# Altium footprint library PcbLib.PcbLib: 142 footprints (part 8 of 9)
Each footprint in its own frame and in the unit in brackets; x right, y up, seen from the top. Pads: shape width x height; smd on the part's side, far side on the other; paste and mask are expansions set on the pad; w line width, h text height; cw(c..) or ccw(c..) is an arc to the next point about the centre after c.
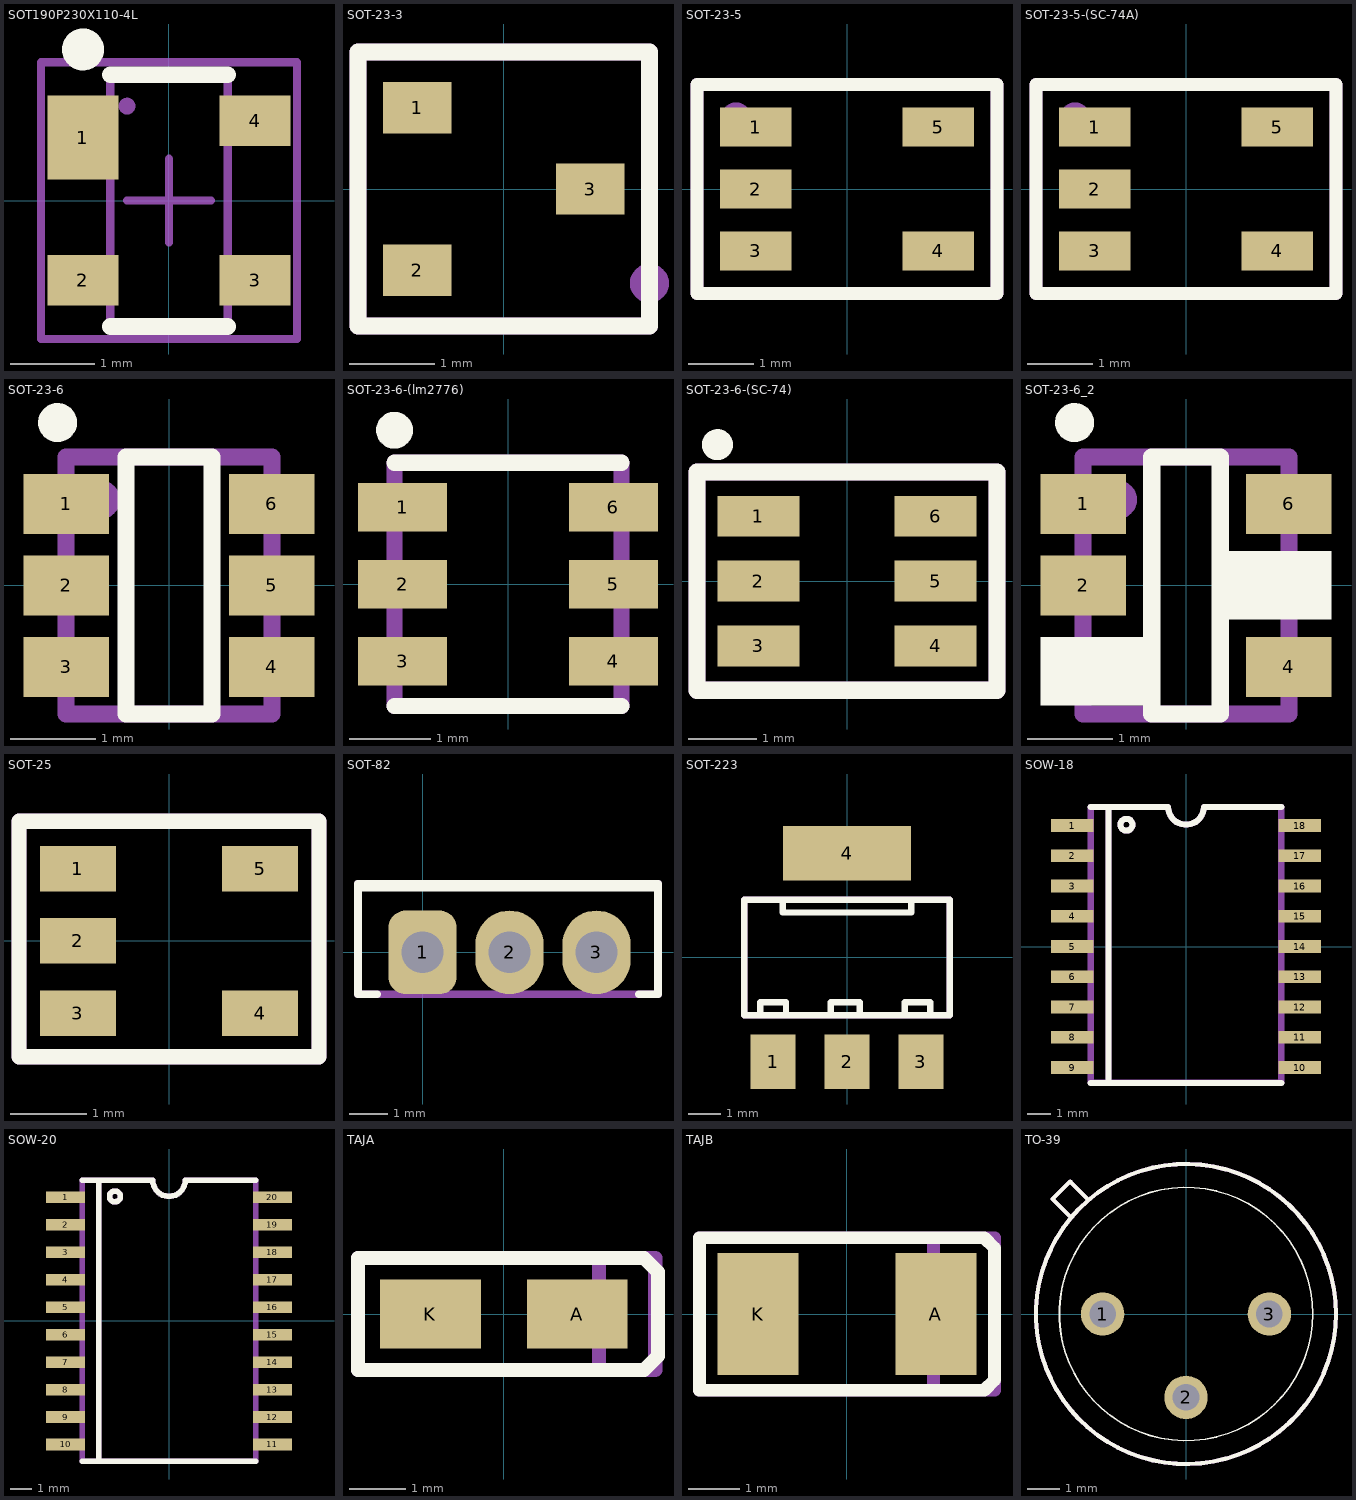
[diagram p7: the footprints below, top view; thin cyan lines are the x and y axes]

## SOT190P230X110-4L [mm]
pads (4):
  rect 0.85x1 smd: 1(-1.025,0.75)
  rect 0.85x0.6 smd: 2(-1.025,-0.95) 3(1.025,-0.95) 4(1.025,0.95)
Top Overlay:
  circle w0.25: c-1.025,1.8 r0.125
  lines w0.2: -0.7,-1.5 0.7,-1.5 ; -0.7,1.5 0.7,1.5
Mechanical 29:
  circle w0.1: c-0.5,1.125 r0.05
  lines w0.1: -0.7,-1.5 -0.7,1.5 0.7,1.5 0.7,-1.5 -0.7,-1.5
  text ".Designator" at -0.152,0.178 h0.3
Mechanical 15:
  lines w0.1: -0.5,0 0.5,0 ; 0,-0.5 0,0.5 ; -1.525,-1.65 -1.525,1.65 1.525,1.65 1.525,-1.65 -1.525,-1.65
3D body "User Library-sot143.step": height 1, standoff 0, extent -1.21,-1.46 1.21,1.46

## SOT-23-3 [mm]
pads (3):
  rect 0.8x0.6 smd: 1(-1.01,0.95) 2(-1.01,-0.95) 3(1.01,0)
Top Overlay:
  lines w0.2: -1.7,-1.6 1.7,-1.6 1.7,1.6 -1.7,1.6 -1.7,-1.6
Mechanical 29:
  circle w0.254: c1.7,-1.1 r0.1
  lines w0.2: -1.7,-1.6 1.7,-1.6 1.7,1.6 -1.7,1.6 -1.7,-1.6
  text ".Designator" at -1.146,-0.513 h1
3D body "CircuitWorks-SOT-23.step": height 1.1, standoff 0, extent -1.25,-1.5 1.25,1.5

## SOT-23-5 [mm]
pads (5):
  rect 1.1x0.6 smd: 1(-1.4,0.95) 2(-1.4,0) 3(-1.4,-0.95) 4(1.4,-0.95) 5(1.4,0.95)
Top Overlay:
  lines w0.2: -2.3,-1.6 2.3,-1.6 2.3,1.6 -2.3,1.6 -2.3,-1.6
Mechanical 29:
  circle w0.254: c-1.7,1.1 r0.1
  lines w0.2: -2.3,-1.6 2.3,-1.6 2.3,1.6 -2.3,1.6 -2.3,-1.6
  text ".Designator" at -1.146,-0.513 h1
3D body "SOT-23-5.step": height 1.1, standoff 0, extent -1.225,-1.5 1.275,1.5

## SOT-23-5-(SC-74A) [mm]
pads (5):
  rect 1.1x0.6 smd: 1(-1.4,0.95) 2(-1.4,0) 3(-1.4,-0.95) 4(1.4,-0.95) 5(1.4,0.95)
Top Overlay:
  lines w0.2: -2.3,-1.6 -2.3,1.6 2.3,1.6 2.3,-1.6 -2.3,-1.6
Mechanical 29:
  circle w0.254: c-1.7,1.1 r0.1
  lines w0.2: -2.3,-1.6 -2.3,1.6 2.3,1.6 2.3,-1.6 -2.3,-1.6
  text ".Designator" at -1.146,-0.513 h1
3D body "SOT95P280X145-5N_EIAJ_SC-74A_MICROCHIP_OT_SOT23_5-LEADS.STEP": height 1.45, standoff 0, extent -1.4,-1.45 1.4,1.5

## SOT-23-6 [mm]
pads (6):
  rect 1x0.7 smd mask+0.05: 1(-1.2,0.95) 2(-1.2,0) 3(-1.2,-0.95) 4(1.2,-0.95) 5(1.2,0) 6(1.2,0.95)
Top Overlay:
  lines w0.2: -0.5,-1.5 0.5,-1.5 0.5,1.5 -0.5,1.5 -0.5,-1.5
  lines w0.254: -1.203,1.876 cw(c-1.3,1.9) -1.2,1.9
Mechanical 29:
  circle w0.254: c-0.8,1 r0.1
  lines w0.2: -1.2,-1.5 -1.2,1.5 1.2,1.5 1.2,-1.5 -1.2,-1.5
  text ".Designator" at -0.8,-0.567 h1
3D body "SOT-23-6.step": height 1.09, standoff 0, extent -1.2,-1.397 1.226,1.397

## SOT-23-6-(lm2776) [mm]
pads (6):
  rect 1.1x0.6 smd: 1(-1.3,0.95) 2(-1.3,0) 3(-1.3,-0.95) 4(1.3,-0.95) 5(1.3,0) 6(1.3,0.95)
Top Overlay:
  circle w0.254: c-1.4,1.9 r0.1
  lines w0.2: -1.4,-1.5 1.4,-1.5 ; -1.4,1.5 1.4,1.5
Mechanical 29:
  circle w0.254: c-1,1 r0.1
  lines w0.2: -1.4,-1.5 -1.4,1.5 1.4,1.5 1.4,-1.5 -1.4,-1.5
  text ".Designator" at -0.9,-0.567 h1
3D body "LM2776DBVR.STEP": height 1.45, standoff 0, extent -1.4,-1.45 1.4,1.45

## SOT-23-6-(SC-74) [mm]
pads (6):
  rect 1.2x0.6 smd: 1(-1.3,0.95) 2(-1.3,0) 3(-1.3,-0.95) 4(1.3,-0.95) 5(1.3,0) 6(1.3,0.95)
Top Overlay:
  circle w0.254: c-1.9,2 r0.1
  lines w0.254: -2.2,-1.6 -2.2,1.6 2.2,1.6 2.2,-1.6 -2.2,-1.6
Mechanical 29:
  circle w0.254: c-1.3,1 r0.1
  lines w0.254: -2.2,-1.6 -2.2,1.6 2.2,1.6 2.2,-1.6 -2.2,-1.6
  text ".Designator" at -0.8,-0.567 h1
3D body "SOT23-6.stp": height 1.2, standoff 0.02, extent -1.418,-1.5 1.418,1.5

## SOT-23-6_2 [mm] "AP6972S"
pads (4):
  rect 1x0.7 smd mask+0.05: 1(-1.2,0.95) 2(-1.2,0) 4(1.2,-0.95) 6(1.2,0.95)
Top Overlay:
  rectangle: -1.7,-1.4 -0.4,-0.6
  rectangle: 0.4,-0.4 1.7,0.4
  lines w0.2: -0.4,-1.5 0.4,-1.5 0.4,1.5 -0.4,1.5 -0.4,-1.5
  lines w0.254: -1.203,1.876 cw(c-1.3,1.9) -1.2,1.9
Mechanical 29:
  circle w0.254: c-0.8,1 r0.1
  lines w0.2: -1.2,-1.5 -1.2,1.5 1.2,1.5 1.2,-1.5 -1.2,-1.5
  text ".Designator" at -0.8,-0.567 h1
3D body "SOT-23-6.step": height 1.09, standoff 0, extent -1.2,-1.397 1.226,1.397

## SOT-25 [mm]
pads (5):
  rect 1x0.6 smd mask+0.08: 1(-1.2,0.95) 2(-1.2,0) 3(-1.2,-0.95) 4(1.2,-0.95) 5(1.2,0.95)
Top Overlay:
  lines w0.2: -0.088,1.575 1.975,1.575 1.975,-1.525 -1.975,-1.525 -1.975,1.575 0.088,1.575
Mechanical 29:
  circle w0.254: c-1.25,0.975 r0.09
  lines w0.2: -0.088,1.575 1.975,1.575 1.975,-1.525 -1.975,-1.525 -1.975,1.575 0.088,1.575
  text ".Designator" at -0.846,-0.538 h1
3D body "SOT-25.step": height 1.2, standoff 0, extent -1.35,-1.425 1.45,1.475

## SOT-82 [mm]
pads (3):
  rrect50% 1.8x2.2 hole 1.1: 1(0,0)
  oval 1.8x2.2 hole 1.1: 2(2.29,0) 3(4.58,0)
Top Overlay:
  lines w0.2: -1.7,1.7 6.1,1.7 ; -1.2,-1.1 -1.7,-1.1 -1.7,1.8 6.2,1.8 6.2,-1.1 5.7,-1.1
Mechanical 29:
  circle w0.254: c0,0 r0.1
  lines w0.2: -1.7,-1.1 -1.7,1.8 6.2,1.8 6.2,-1.1 -1.7,-1.1
  text ".Designator" at 0.8,-0.167 h1
3D body "User Library-SOT-82.step": height 17.2, standoff -9.44, extent -1.61,-1.01 6.19,1.79

## SOT-223 [mm]
pads (4):
  rect 1.4x1.7 smd: 1(-2.3,-3.25) 2(0,-3.25) 3(2.3,-3.25)
  rect 4x1.7 smd: 4(0,3.25)
Top Overlay:
  lines w0.2: -2.7,-1.8 -2.7,-1.4 -1.9,-1.4 -1.9,-1.8 ; -2,1.8 -2,1.4 2,1.4 2,1.8 ; -0.5,-1.8 -0.5,-1.4 0.4,-1.4 0.4,-1.6 0.4,-1.8 ; 1.8,-1.8 1.8,-1.4 2.6,-1.4 2.6,-1.7 ; -3.2,-1.8 -3.2,1.8 3.2,1.8 3.2,-1.8 -3.2,-1.8
Mechanical 29:
  lines w0.2: -3.2,-1.8 3.2,-1.8 3.2,1.8 -3.2,1.8 -3.2,-1.8
  text ".Designator" at -1.3,-0.367 h1
3D body "User Library-sot-223.step": height 1.64, standoff -0.04, extent -3.25,-3.466 3.25,3.466

## SOW-18 [mil]
pads (18):
  rect 71x21 smd: 1(-188,200) 2(-188,150) 3(-188,100) 4(-188,50) 5(-188,0) 6(-188,-50) 7(-188,-100) 8(-188,-150) 9(-188,-200) 10(188,-200) 11(188,-150) 12(188,-100) 13(188,-50) 14(188,0) 15(188,50) 16(188,100) 17(188,150) 18(188,200)
Top Overlay:
  circle w10: c-98.43,201.38 r9.84
  lines w10: -157.48,-225.79 157.48,-225.79 ; -157.48,230.91 -29.53,230.91 ccw(c0,230.91) 29.53,230.91 157.48,230.91 ; -127.95,-224.41 -127.95,230.91
Mechanical 29:
  circle w10: c-98.43,201.38 r9.84
  lines w10: -127.95,-224.41 -127.95,230.91 ; -157.48,-224.41 157.48,-224.41 157.48,230.91 29.53,230.91 cw(c0,230.91) -29.53,230.91 -157.48,230.91 -157.48,-224.41
  text ".Designator" at 18.38,-95.87 h39.37
3D body "SOIC18 wide.stp": height 78.6, standoff -0.01, extent -200.06,-223.43 200.06,223.43

## SOW-20 [mil]
pads (20):
  rect 71x21 smd: 1(-188,225) 2(-188,175) 3(-188,125) 4(-188,75) 5(-188,25) 6(-188,-25) 7(-188,-75) 8(-188,-125) 9(-188,-175) 10(-188,-225) 11(188,-225) 12(188,-175) 13(188,-125) 14(188,-75) 15(188,-25) 16(188,25) 17(188,75) 18(188,125) 19(188,175) 20(188,225)
Top Overlay:
  circle w10: c-98.43,226.38 r9.84
  lines w10: -157.48,-255.91 157.48,-255.91 ; -157.48,255.91 -29.53,255.91 ccw(c0,255.91) 29.53,255.91 157.48,255.91 ; -127.95,-255.91 -127.95,255.91
Mechanical 29:
  circle w10: c-98.43,226.38 r9.84
  lines w10: -127.95,-255.91 -127.95,255.91 ; -157.48,-255.91 -157.48,255.91 -29.53,255.91 ccw(c0,255.91) 29.53,255.91 157.48,255.91 157.48,-255.91 -157.48,-255.91
  text ".Designator" at 18.38,-70.87 h39.37
3D body "SOIC20 wide.stp": height 78.74, standoff -0.01, extent -200.06,-255.9 200.06,255.91

## TAJA [mm]
pads (2):
  rect 1.8x1.23 smd: A(1.31,0) K(-1.31,0)
Top Overlay:
  lines w0.254: -2.6,-1 -2.6,1 2.25,1 2.5,1 2.75,0.75 2.75,-0.75 2.5,-1 -2.6,-1
Mechanical 29:
  lines w0.254: 1.7,-1 1.7,1 ; -2.6,-1 -2.6,1 2.7,1 2.7,-1 -2.6,-1
  text ".Designator" at -2,-0.467 h1
3D body "A 3216-18.step": height 1.61, standoff 0, extent -1.6,-0.8 1.6,0.8

## TAJB [mm]
pads (2):
  rect 1.6x2.4 smd: A(1.75,0) K(-1.75,0)
Top Overlay:
  lines w0.254: -2.9,-1.5 2.7,-1.5 2.9,-1.3 2.9,1.3 2.7,1.5 -2.9,1.5 -2.9,-1.5
Mechanical 29:
  lines w0.254: 1.7,-1.5 1.7,1.5 ; -2.9,-1.5 2.9,-1.5 2.9,1.5 -2.9,1.5 -2.9,-1.5
  text ".Designator" at -1.5,-0.467 h1
3D body "B 3528-21.step": height 1.91, standoff 0, extent -1.75,-1.4 1.75,1.4

## TO-39 [mil]
pads (3):
  round 52 hole 32: 1(-100,0) 2(0,-100) 3(100,0)
Top Overlay:
  circle w5: c0,0 r180
  circle w2: c0,0 r152
  lines w5: -139,117 -160,138 -139,159 -118,138
Mechanical 29:
  circle w5: c0,0 r180
  lines w5: -139,117 -160,138 -139,159 -118,138
  text ".Designator" at -66.93,-7.88 h59.06
3D body: height 19.68, standoff 0, extent -177.17,-177.17 177.17,177.17
3D body: height 129.92, standoff 0, extent -157.48,-157.48 157.48,157.48
3D body: height 39.37, standoff -196.85, extent -108.86,-8.86 -91.14,8.86
3D body: height 39.37, standoff -196.85, extent 91.14,-8.86 108.86,8.86
3D body: height 39.37, standoff -196.85, extent -8.86,-108.86 8.86,-91.14
3D body: height 19.68, standoff 0, extent -157.48,108.27 -108.27,157.48